# Altium footprint library Active.PcbLib: 308 footprints (part 9 of 22)
Each footprint in its own frame and in the unit in brackets; x right, y up, seen from the top. Pads: shape width x height; smd on the part's side, far side on the other; paste and mask are expansions set on the pad; w line width, h text height; cw(c..) or ccw(c..) is an arc to the next point about the centre after c.
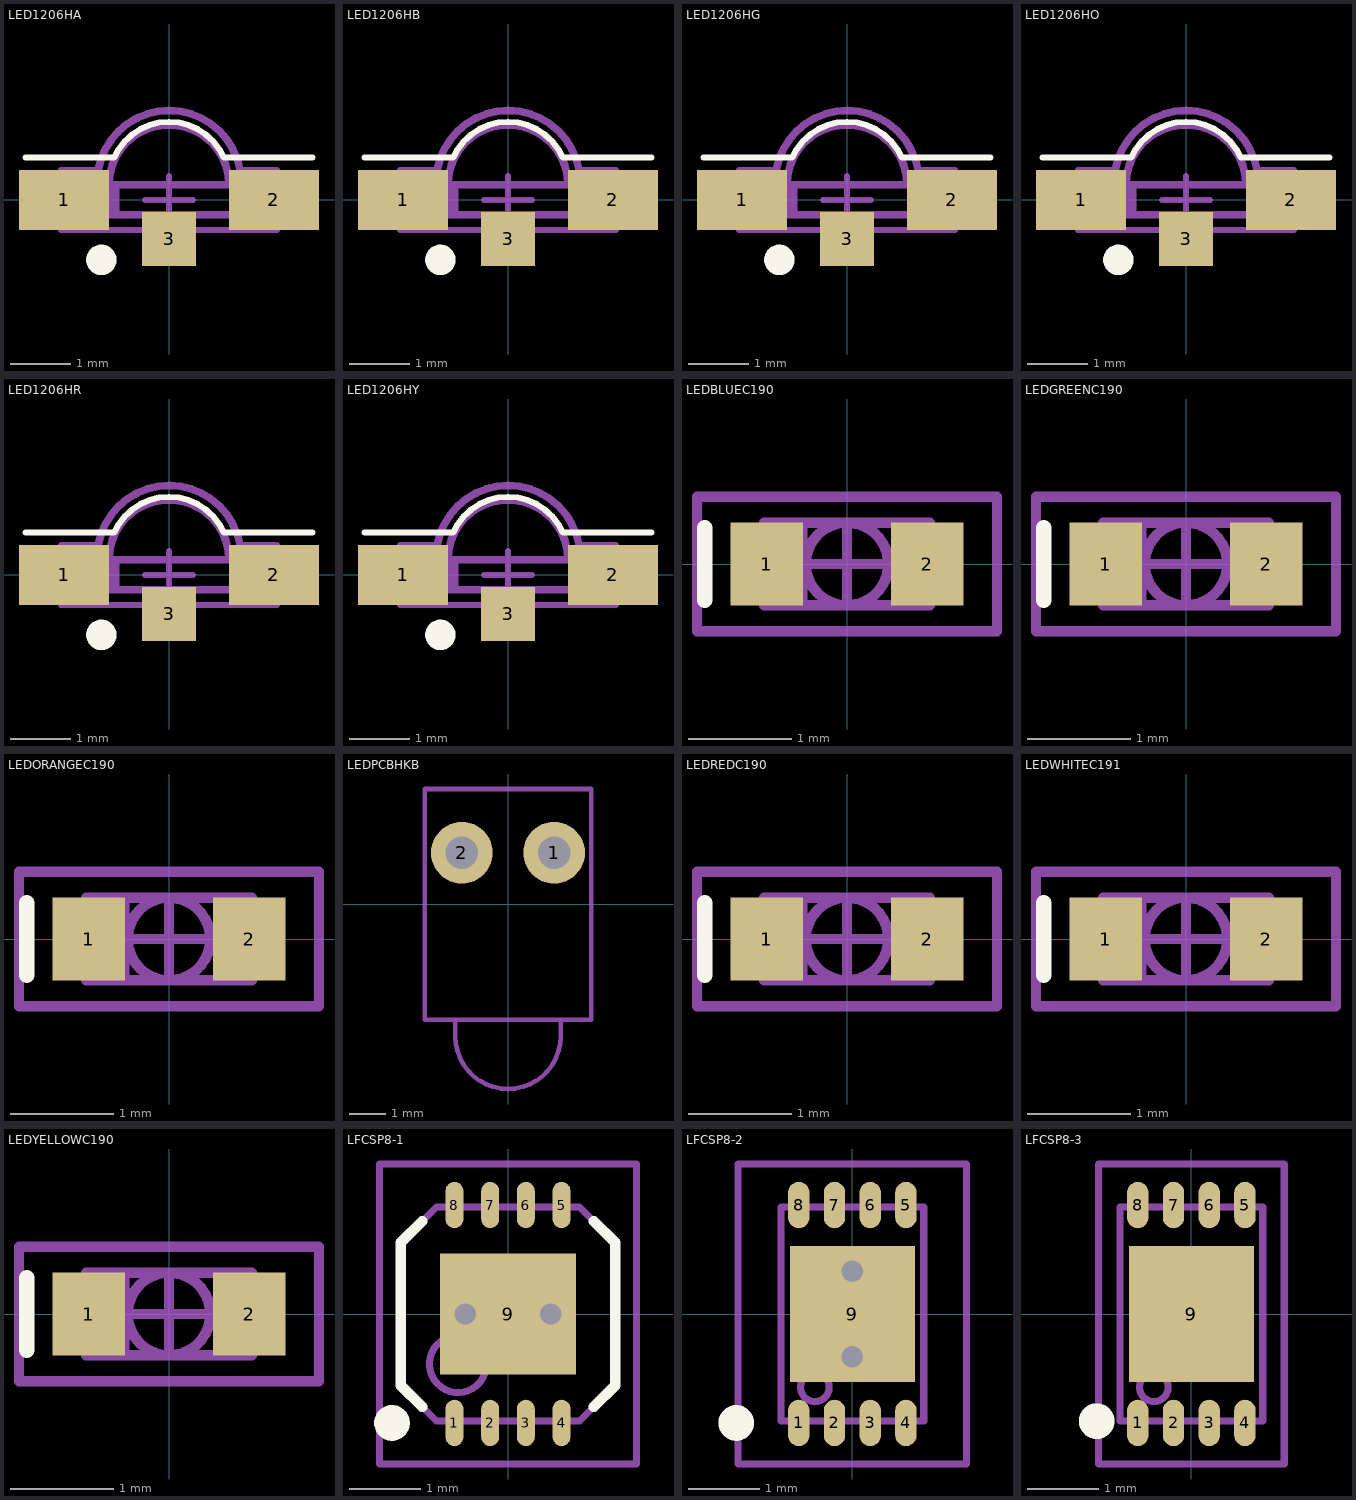
[diagram p8: the footprints below, top view; thin cyan lines are the x and y axes]

## LED1206HA [mm] "LED chip C110 3.2x1.0x1.5mm Side Amber"
height 1.5
pads (3):
  rect 1.5x1 smd: 1(-1.75,0) 2(1.75,0)
  rect 0.9x0.9 smd mask+0.1: 3(0,-0.65)
Top Overlay:
  circle w0.254: c-1.127,-1 r0.127
  lines w0.102: -2.394,0.706 -0.914,0.706 cw(c0,0.3) 0.914,0.706 2.394,0.706
Mechanical 13:
  region: -0.825,0.25 -1.375,0.25 -1.375,-0.25 -0.825,-0.25
  lines w0.127: -1,0.25 cw(c0,0.25) 1,0.25 ; -1.6,-0.25 -1.6,0.25 1.6,0.25 1.6,-0.25 -1.6,-0.25
Mechanical 15:
  lines w0.1: -1.175,0.5 -1.8,0.5 -1.8,-0.5 1.8,-0.5 1.8,0.5 1.175,0.5
  lines w0.102: -0.4,0 0.4,0 ; 0,-0.4 0,0.4
  lines w0.127: -1.177,0.509 cw(c0.003,0.29) 1.183,0.506
3D body: height 1, standoff 0, extent -0.9,-0.25 0.9,0.25
3D body: height 1, standoff 0, extent 0.9,-0.25 1.6,0.25
3D body: height 1, standoff 0, extent -1.6,-0.25 -0.9,0.25
3D body: height 1, standoff 0, extent -1.009,0.25 1.009,1.259
3D body: height 1.02, standoff 0, extent -0.775,-0.325 -0.5,0.25

## LED1206HB [mm] "LED chip C110 3.2x1.0x1.5mm Side Blue"
height 1.5
pads (3):
  rect 1.5x1 smd: 1(-1.75,0) 2(1.75,0)
  rect 0.9x0.9 smd mask+0.1: 3(0,-0.65)
Top Overlay:
  circle w0.254: c-1.127,-1 r0.127
  lines w0.102: -2.394,0.706 -0.914,0.706 cw(c0,0.3) 0.914,0.706 2.394,0.706
Mechanical 13:
  region: -0.825,0.25 -1.375,0.25 -1.375,-0.25 -0.825,-0.25
  lines w0.127: -1,0.25 cw(c0,0.25) 1,0.25 ; -1.6,-0.25 -1.6,0.25 1.6,0.25 1.6,-0.25 -1.6,-0.25
Mechanical 15:
  lines w0.1: -1.175,0.5 -1.8,0.5 -1.8,-0.5 1.8,-0.5 1.8,0.5 1.175,0.5
  lines w0.102: -0.4,0 0.4,0 ; 0,-0.4 0,0.4
  lines w0.127: -1.177,0.509 cw(c0.003,0.29) 1.183,0.506
3D body: height 1, standoff 0, extent -0.9,-0.25 0.9,0.25
3D body: height 1, standoff 0, extent 0.9,-0.25 1.6,0.25
3D body: height 1, standoff 0, extent -1.6,-0.25 -0.9,0.25
3D body: height 1, standoff 0, extent -1.009,0.25 1.009,1.259
3D body: height 1.02, standoff 0, extent -0.775,-0.325 -0.5,0.25

## LED1206HG [mm] "LED chip C110 3.2x1.0x1.5mm Side Green"
height 1.5
pads (3):
  rect 1.5x1 smd: 1(-1.75,0) 2(1.75,0)
  rect 0.9x0.9 smd mask+0.1: 3(0,-0.65)
Top Overlay:
  circle w0.254: c-1.127,-1 r0.127
  lines w0.102: -2.394,0.706 -0.914,0.706 cw(c0,0.3) 0.914,0.706 2.394,0.706
Mechanical 13:
  region: -0.825,0.25 -1.375,0.25 -1.375,-0.25 -0.825,-0.25
  lines w0.127: -1,0.25 cw(c0,0.25) 1,0.25 ; -1.6,-0.25 -1.6,0.25 1.6,0.25 1.6,-0.25 -1.6,-0.25
Mechanical 15:
  lines w0.1: -1.175,0.5 -1.8,0.5 -1.8,-0.5 1.8,-0.5 1.8,0.5 1.175,0.5
  lines w0.102: -0.4,0 0.4,0 ; 0,-0.4 0,0.4
  lines w0.127: -1.177,0.509 cw(c0.003,0.29) 1.183,0.506
3D body: height 1, standoff 0, extent -0.9,-0.25 0.9,0.25
3D body: height 1, standoff 0, extent 0.9,-0.25 1.6,0.25
3D body: height 1, standoff 0, extent -1.6,-0.25 -0.9,0.25
3D body: height 1, standoff 0, extent -1.009,0.25 1.009,1.259
3D body: height 1.02, standoff 0, extent -0.775,-0.325 -0.5,0.25

## LED1206HO [mm] "LED chip C110 3.2x1.0x1.5mm Side Orange"
height 1.5
pads (3):
  rect 1.5x1 smd: 1(-1.75,0) 2(1.75,0)
  rect 0.9x0.9 smd mask+0.1: 3(0,-0.65)
Top Overlay:
  circle w0.254: c-1.127,-1 r0.127
  lines w0.102: -2.394,0.706 -0.914,0.706 cw(c0,0.3) 0.914,0.706 2.394,0.706
Mechanical 13:
  region: -0.825,0.25 -1.375,0.25 -1.375,-0.25 -0.825,-0.25
  lines w0.127: -1,0.25 cw(c0,0.25) 1,0.25 ; -1.6,-0.25 -1.6,0.25 1.6,0.25 1.6,-0.25 -1.6,-0.25
Mechanical 15:
  lines w0.1: -1.175,0.5 -1.8,0.5 -1.8,-0.5 1.8,-0.5 1.8,0.5 1.175,0.5
  lines w0.102: -0.4,0 0.4,0 ; 0,-0.4 0,0.4
  lines w0.127: -1.177,0.509 cw(c0.003,0.29) 1.183,0.506
3D body: height 1, standoff 0, extent -0.9,-0.25 0.9,0.25
3D body: height 1, standoff 0, extent 0.9,-0.25 1.6,0.25
3D body: height 1, standoff 0, extent -1.6,-0.25 -0.9,0.25
3D body: height 1, standoff 0, extent -1.009,0.25 1.009,1.259
3D body: height 1.02, standoff 0, extent -0.775,-0.325 -0.5,0.25

## LED1206HR [mm] "LED chip C110 3.2x1.5x1.0mm Side Red"
height 1
pads (3):
  rect 1.5x1 smd: 1(-1.75,0) 2(1.75,0)
  rect 0.9x0.9 smd mask+0.1: 3(0,-0.65)
Top Overlay:
  circle w0.254: c-1.127,-1 r0.127
  lines w0.102: -2.394,0.706 -0.914,0.706 cw(c0,0.3) 0.914,0.706 2.394,0.706
Mechanical 13:
  region: -0.825,0.25 -1.375,0.25 -1.375,-0.25 -0.825,-0.25
  lines w0.127: -1,0.25 cw(c0,0.25) 1,0.25 ; -1.6,-0.25 -1.6,0.25 1.6,0.25 1.6,-0.25 -1.6,-0.25
Mechanical 15:
  lines w0.1: -1.175,0.5 -1.8,0.5 -1.8,-0.5 1.8,-0.5 1.8,0.5 1.175,0.5
  lines w0.102: -0.4,0 0.4,0 ; 0,-0.4 0,0.4
  lines w0.127: -1.177,0.509 cw(c0.003,0.29) 1.183,0.506
3D body: height 1, standoff 0, extent -0.9,-0.25 0.9,0.25
3D body: height 1, standoff 0, extent 0.9,-0.25 1.6,0.25
3D body: height 1, standoff 0, extent -1.6,-0.25 -0.9,0.25
3D body: height 1, standoff 0, extent -1.009,0.25 1.009,1.259
3D body: height 1.02, standoff 0, extent -0.775,-0.325 -0.5,0.25

## LED1206HY [mm] "LED chip C110 3.2x1.0x1.5mm Side Yellow"
height 1.5
pads (3):
  rect 1.5x1 smd: 1(-1.75,0) 2(1.75,0)
  rect 0.9x0.9 smd mask+0.1: 3(0,-0.65)
Top Overlay:
  circle w0.254: c-1.127,-1 r0.127
  lines w0.102: -2.394,0.706 -0.914,0.706 cw(c0,0.3) 0.914,0.706 2.394,0.706
Mechanical 13:
  region: -0.825,0.25 -1.375,0.25 -1.375,-0.25 -0.825,-0.25
  lines w0.127: -1,0.25 cw(c0,0.25) 1,0.25 ; -1.6,-0.25 1.6,-0.25 1.6,0.25 -1.6,0.25 -1.6,-0.25
Mechanical 15:
  lines w0.1: -1.175,0.5 -1.8,0.5 -1.8,-0.5 1.8,-0.5 1.8,0.5 1.175,0.5
  lines w0.102: -0.4,0 0.4,0 ; 0,-0.4 0,0.4
  lines w0.127: -1.177,0.509 cw(c0.003,0.29) 1.183,0.506
3D body: height 1.02, standoff 0, extent -0.775,-0.325 -0.5,0.25
3D body: height 1, standoff 0, extent -1.009,0.25 1.009,1.259
3D body: height 1, standoff 0, extent -1.6,-0.25 -0.9,0.25
3D body: height 1, standoff 0, extent 0.9,-0.25 1.6,0.25
3D body: height 1, standoff 0, extent -0.9,-0.25 0.9,0.25

## LEDBLUEC190 [mm] "LED chip C190 1.6x0.8x0.8mm vertical"
height 0.8
pads (2):
  rect 0.7x0.8 smd: 1(-0.775,0) 2(0.775,0)
Top Overlay:
  lines w0.15: -1.375,-0.35 -1.375,0.35
Mechanical 13:
  circle w0.102: c0,0 r0.4
  rectangle: -0.8,-0.4 -0.381,0.4
  lines w0.1: -0.8,-0.4 -0.8,0.4 0.8,0.4 0.8,-0.4 -0.8,-0.4
Mechanical 15:
  lines w0.1: -0.4,0 0.4,0 ; 0,-0.4 0,0.4 ; -1.45,-0.65 -1.45,0.65 1.45,0.65 1.45,-0.65 -1.45,-0.65
3D body: height 0.3, standoff 0, extent -0.8,-0.4 0.8,0.4
3D body: height 0.8, standoff 0.3, extent -0.5,-0.4 0.5,0.4
3D body: height 0.31, standoff 0.3, extent -0.799,-0.4 -0.5,-0.1

## LEDGREENC190 [mm] "LED chip C190 1.6x0.8x0.8mm vertical"
height 0.8
pads (2):
  rect 0.7x0.8 smd: 1(-0.775,0) 2(0.775,0)
Top Overlay:
  lines w0.15: -1.375,-0.35 -1.375,0.35
Mechanical 13:
  circle w0.102: c0,0 r0.4
  rectangle: -0.8,-0.4 -0.381,0.4
  lines w0.1: -0.8,-0.4 -0.8,0.4 0.8,0.4 0.8,-0.4 -0.8,-0.4
Mechanical 15:
  lines w0.1: -0.4,0 0.4,0 ; 0,-0.4 0,0.4 ; -1.45,-0.65 -1.45,0.65 1.45,0.65 1.45,-0.65 -1.45,-0.65
3D body: height 0.3, standoff 0, extent -0.8,-0.4 0.8,0.4
3D body: height 0.8, standoff 0.3, extent -0.5,-0.4 0.5,0.4
3D body: height 0.31, standoff 0.3, extent -0.799,-0.4 -0.5,-0.1

## LEDORANGEC190 [mm] "LED chip C190 1.6x0.8x0.8mm vertical orange"
height 0.8
pads (2):
  rect 0.7x0.8 smd: 1(-0.775,0) 2(0.775,0)
Top Overlay:
  lines w0.15: -1.375,-0.35 -1.375,0.35
Mechanical 13:
  circle w0.102: c0,0 r0.4
  rectangle: -0.8,-0.4 -0.381,0.4
  lines w0.1: -0.8,-0.4 0.8,-0.4 0.8,0.4 -0.8,0.4 -0.8,-0.4
Mechanical 15:
  lines w0.1: -0.4,0 0.4,0 ; 0,-0.4 0,0.4 ; -1.45,-0.65 1.45,-0.65 1.45,0.65 -1.45,0.65 -1.45,-0.65
3D body: height 0.8, standoff 0.3, extent -0.5,-0.4 0.5,0.4
3D body: height 0.3, standoff 0, extent -0.8,-0.4 0.8,0.4
3D body: height 0.31, standoff 0.3, extent -0.799,-0.4 -0.5,-0.1

## LEDPCBHKB [mm] "Right angle LED indicator 4.6x6.35x7.3mm"
height 7.5
pads (2):
  round 1.7 hole 0.9: 1(1.27,1.422) 2(-1.27,1.422)
Mechanical 13:
  lines w0.127: -1.448,-3.175 -1.448,-3.632 ccw(c0,-3.632) 1.448,-3.632 1.448,-3.175 ; -2.286,-3.175 2.286,-3.175 2.286,3.175 -2.286,3.175 -2.286,-3.175
3D body: height 7.3, standoff 0, extent -2.286,-3.175 2.286,3.175

## LEDREDC190 [mm] "LED chip C190 1.6x0.8x0.8mm vertical"
height 0.8
pads (2):
  rect 0.7x0.8 smd: 1(-0.775,0) 2(0.775,0)
Top Overlay:
  lines w0.15: -1.375,-0.35 -1.375,0.35
Mechanical 13:
  circle w0.102: c0,0 r0.4
  rectangle: -0.8,-0.4 -0.381,0.4
  lines w0.1: -0.8,-0.4 -0.8,0.4 0.8,0.4 0.8,-0.4 -0.8,-0.4
Mechanical 15:
  lines w0.1: -0.4,0 0.4,0 ; 0,-0.4 0,0.4 ; -1.45,-0.65 -1.45,0.65 1.45,0.65 1.45,-0.65 -1.45,-0.65
3D body: height 0.3, standoff 0, extent -0.8,-0.4 0.8,0.4
3D body: height 0.8, standoff 0.3, extent -0.5,-0.4 0.5,0.4
3D body: height 0.31, standoff 0.3, extent -0.799,-0.4 -0.5,-0.1

## LEDWHITEC191 [mm] "LED chip C190 1.6x0.8x0.6mm vertical"
height 0.6
pads (2):
  rect 0.7x0.8 smd: 1(-0.775,0) 2(0.775,0)
Top Overlay:
  lines w0.15: -1.375,-0.35 -1.375,0.35
Mechanical 13:
  circle w0.102: c0,0 r0.4
  rectangle: -0.8,-0.4 -0.381,0.4
  lines w0.1: -0.8,-0.4 0.8,-0.4 0.8,0.4 -0.8,0.4 -0.8,-0.4
Mechanical 15:
  lines w0.1: -0.4,0 0.4,0 ; 0,-0.4 0,0.4 ; -1.45,-0.65 1.45,-0.65 1.45,0.65 -1.45,0.65 -1.45,-0.65
3D body: height 0.8, standoff 0.3, extent -0.5,-0.4 0.5,0.4
3D body: height 0.3, standoff 0, extent -0.8,-0.4 0.8,0.4
3D body: height 0.31, standoff 0.3, extent -0.799,-0.4 -0.5,-0.1

## LEDYELLOWC190 [mm] "LED chip C190 1.6x0.8x0.8mm vertical"
height 0.8
pads (2):
  rect 0.7x0.8 smd: 1(-0.775,0) 2(0.775,0)
Top Overlay:
  lines w0.15: -1.375,-0.35 -1.375,0.35
Mechanical 13:
  circle w0.102: c0,0 r0.4
  rectangle: -0.8,-0.4 -0.381,0.4
  lines w0.1: -0.8,-0.4 0.8,-0.4 0.8,0.4 -0.8,0.4 -0.8,-0.4
Mechanical 15:
  lines w0.1: -0.4,0 0.4,0 ; 0,-0.4 0,0.4 ; -1.45,-0.65 1.45,-0.65 1.45,0.65 -1.45,0.65 -1.45,-0.65
3D body: height 0.8, standoff 0.3, extent -0.5,-0.4 0.5,0.4
3D body: height 0.3, standoff 0, extent -0.8,-0.4 0.8,0.4
3D body: height 0.31, standoff 0.3, extent -0.799,-0.4 -0.5,-0.1

## LFCSP8-1 [mm]
height 0.9
pads (9):
  oval 0.25x0.65 smd mask+0.038: 1(-0.75,-1.525) 2(-0.25,-1.525) 3(0.25,-1.525) 4(0.75,-1.525) 5(0.75,1.525) 6(0.25,1.525) 7(-0.25,1.525) 8(-0.75,1.525)
  rect 1.9x1.7 smd paste-4 mask-4: 9(0,0)
via 0.6,0 diameter 0.65 hole 0.3
via -0.6,0 diameter 0.65 hole 0.3
Top Overlay:
  circle w0.25: c-1.625,-1.525 r0.125
  lines w0.15: -1.2,-1.3 -1.5,-1 -1.5,1 -1.2,1.3 ; 1.2,-1.3 1.5,-1 1.5,1 1.2,1.3
Top Paste:
  region: -0.95,-0.85 -0.95,-0.3 -0.45,-0.3 -0.3,-0.15 0.3,-0.15 0.45,-0.3 0.95,-0.3 0.95,-0.85
  region: -0.95,0.85 -0.95,0.3 -0.45,0.3 -0.3,0.15 0.3,0.15 0.45,0.3 0.95,0.3 0.95,0.85
Top Solder:
  region: 1,0.9 0.6,0.9 0.6,0.331 0.727,0.306 0.834,0.234 0.906,0.127 0.931,0 0.906,-0.127 0.834,-0.234 0.727,-0.306 0.6,-0.331 0.473,-0.306 0.366,-0.234 0.294,-0.127 0.269,0 0.275,0 0.269,0 0.294,0.127 0.366,0.234 0.473,0.306 0.6,0.331 0.6,0.325 0.6,0.9 0,0.9 0,-0.9 1,-0.9
  region: -1,0.9 -0.6,0.9 -0.6,0.331 -0.727,0.306 -0.834,0.234 -0.906,0.127 -0.931,0 -0.906,-0.127 -0.834,-0.234 -0.727,-0.306 -0.6,-0.331 -0.473,-0.306 -0.366,-0.234 -0.294,-0.127 -0.269,0 -0.275,0 -0.269,0 -0.294,0.127 -0.366,0.234 -0.473,0.306 -0.6,0.331 -0.6,0.325 -0.6,0.9 0,0.9 0,-0.9 -1,-0.9
Mechanical 13:
  circle w0.1: c-0.7,-0.7 r0.4
  lines w0.1: -1.5,-1 -1,-1.5 1,-1.5 1.5,-1 1.5,1 1,1.5 -1,1.5 -1.5,1 -1.5,-1
Mechanical 15:
  lines w0.1: -0.5,0 0.5,0 ; 0,-0.5 0,0.5 ; -1.8,-2.1 1.8,-2.1 1.8,2.1 -1.8,2.1 -1.8,-2.1
3D body: height 0.91, standoff 0.9, extent -1.108,-1.108 -0.292,-0.292
3D body: height 0.9, standoff 0.6, extent -1.3,-1.3 1.3,1.3
3D body: height 0.6, standoff 0.02, extent -1.5,-1.5 1.5,1.5

## LFCSP8-2 [mm] "QFN, 8-Leads, Body 3,0x2,0mm (max), Pitch 0,50mm, IPC Medium Density"
height 0.8
pads (9):
  oval 0.3x0.65 smd mask+0.051: 1(-0.75,-1.525) 2(-0.25,-1.525) 3(0.25,-1.525) 4(0.75,-1.525) 5(0.75,1.525) 6(0.25,1.525) 7(-0.25,1.525) 8(-0.75,1.525)
  rect 1.75x1.9 smd paste-8 mask-8: 9(0,0)
via 0,-0.6 diameter 0.65 hole 0.3
via 0,0.6 diameter 0.65 hole 0.3
Top Overlay:
  circle w0.25: c-1.625,-1.525 r0.125
Top Paste:
  region: -0.875,0.95 -0.35,0.95 -0.35,0.475 -0.125,0.25 -0.125,0 -0.875,0
  region: -0.875,-0.95 -0.35,-0.95 -0.35,-0.475 -0.125,-0.25 -0.125,0 -0.875,0
  region: 0.875,-0.95 0.35,-0.95 0.35,-0.475 0.125,-0.25 0.125,0 0.875,0
  region: 0.875,0.95 0.35,0.95 0.35,0.475 0.125,0.25 0.125,0 0.875,0
Top Solder:
  circle w0.05: c0,-0.6 r0.36
  circle w0.05: c0,0.6 r0.36
  region: 0,1.016 0.94,1.016 0.94,-1.016 0,-1.016 0,-0.971 0.12,-0.947 0.221,-0.88 0.217,-0.875 0.307,-0.79 0.346,-0.732 0.359,-0.665 0.356,-0.665 0.36,-0.584 0.341,-0.488 0.287,-0.407 0.284,-0.411 0.18,-0.302 0.123,-0.264 0.055,-0.251 0.055,-0.254 0,-0.254 0,0.223 0.12,0.246 0.221,0.314 0.217,0.318 0.304,0.401 0.345,0.462 0.359,0.533 0.356,0.533 0.361,0.629 0.341,0.73 0.283,0.816 0.279,0.813 0.221,0.88 0.12,0.947 0,0.971 0,0.965
  region: 0,1.016 -0.94,1.016 -0.94,-1.016 0,-1.016 0,-0.971 -0.12,-0.947 -0.221,-0.88 -0.217,-0.875 -0.307,-0.79 -0.346,-0.732 -0.359,-0.665 -0.356,-0.665 -0.36,-0.584 -0.341,-0.488 -0.287,-0.407 -0.284,-0.411 -0.18,-0.302 -0.123,-0.264 -0.055,-0.251 -0.055,-0.254 0,-0.254 0,0.223 -0.12,0.246 -0.221,0.314 -0.217,0.318 -0.304,0.401 -0.345,0.462 -0.359,0.533 -0.356,0.533 -0.361,0.629 -0.341,0.73 -0.283,0.816 -0.279,0.813 -0.221,0.88 -0.12,0.947 0,0.971 0,0.965
Mechanical 13:
  circle w0.1: c-0.525,-1.025 r0.2
  lines w0.1: -1,-1.5 1,-1.5 1,1.5 -1,1.5 -1,-1.5
Mechanical 15:
  lines w0.1: -0.5,0 0.5,0 ; 0,-0.5 0,0.5 ; -1.6,-2.1 1.6,-2.1 1.6,2.1 -1.6,2.1 -1.6,-2.1
3D body: height 0.8, standoff 0.01, extent -1,-1.5 1,1.5
3D body: height 0.81, standoff 0.8, extent -0.724,-1.225 -0.326,-0.826

## LFCSP8-3 [mm] "QFN, 8-Leads, Body 3,0x2,0mm (max), Pitch 0,50mm, IPC Medium Density"
height 0.8
pads (9):
  oval 0.3x0.65 smd mask+0.051: 1(-0.75,-1.525) 2(-0.25,-1.525) 3(0.25,-1.525) 4(0.75,-1.525) 5(0.75,1.525) 6(0.25,1.525) 7(-0.25,1.525) 8(-0.75,1.525)
  rect 1.75x1.9 smd paste-0.2 mask+0.05: 9(0,0)
Top Overlay:
  circle w0.25: c-1.325,-1.5 r0.125
Mechanical 13:
  circle w0.1: c-0.525,-1.025 r0.2
  lines w0.1: -1,-1.5 1,-1.5 1,1.5 -1,1.5 -1,-1.5
Mechanical 15:
  lines w0.1: -0.5,0 0.5,0 ; 0,-0.5 0,0.5 ; -1.3,-2.1 1.3,-2.1 1.3,2.1 -1.3,2.1 -1.3,-2.1
3D body: height 0.8, standoff 0.01, extent -1,-1.5 1,1.5
3D body: height 0.81, standoff 0.8, extent -0.724,-1.225 -0.326,-0.826